# Altium footprint library ALL.PcbLib: 385 footprints (part 9 of 25)
Each footprint in its own frame and in the unit in brackets; x right, y up, seen from the top. Pads: shape width x height; smd on the part's side, far side on the other; paste and mask are expansions set on the pad; w line width, h text height; cw(c..) or ccw(c..) is an arc to the next point about the centre after c.
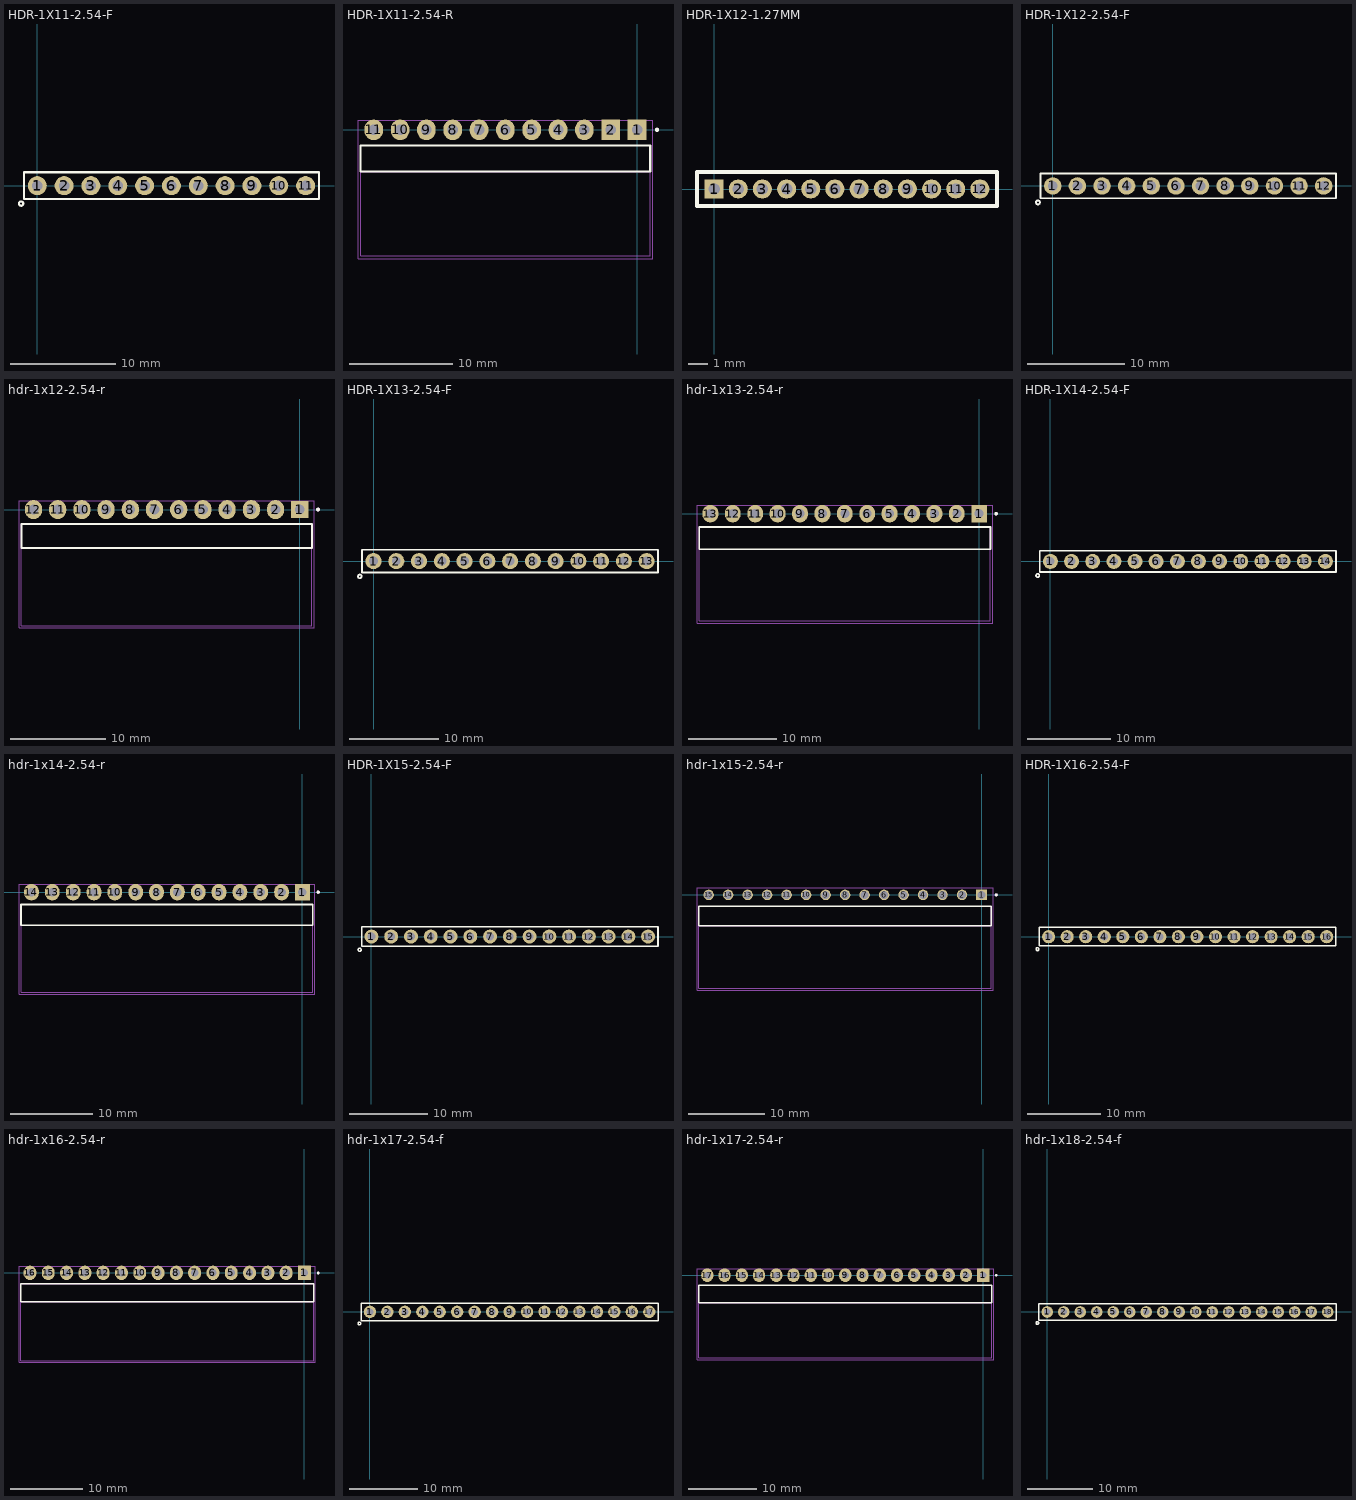
[diagram p8: the footprints below, top view; thin cyan lines are the x and y axes]

## HDR-1X11-2.54-F [mm]
pads (11):
  round 1.8 hole 1: 1(0,0) 2(2.54,0) 3(5.08,0) 4(7.62,0) 5(10.16,0) 6(12.7,0) 7(15.24,0) 8(17.78,0) 9(20.32,0) 10(22.86,0) 11(25.4,0)
Top Overlay:
  circle w0.2: c-1.53,-1.7 r0.2
  lines w0.2: -1.27,-1.27 26.67,-1.27 26.67,1.27 -1.27,1.27 -1.27,-1.27
3D body "PBD-2.stp": height 8.5, standoff -3.15, extent 19.05,-1.27 24.13,1.27
3D body "PBD-2.stp": height 8.5, standoff -3.15, extent 13.97,-1.27 19.05,1.27
3D body "PBD-2.stp": height 8.5, standoff -3.15, extent 8.89,-1.27 13.97,1.27
3D body "PBD-2.stp": height 8.5, standoff -3.15, extent 3.81,-1.27 8.89,1.27
3D body "PBD-2.stp": height 8.5, standoff -3.15, extent -1.27,-1.27 3.81,1.27
3D body "PBS-1.stp": height 8.5, standoff -3.15, extent 24.13,-1.27 26.67,1.27

## HDR-1X11-2.54-R [mm]
pads (11):
  rect 1.8x2 hole 1.02: 1(0,0) 2(-2.54,0)
  oval 1.8x2 hole 1.02: 3(-5.08,0) 4(-7.62,0) 5(-10.16,0) 6(-12.7,0) 7(-15.24,0) 8(-17.78,0) 9(-20.32,0) 10(-22.86,0) 11(-25.4,0)
Top Overlay:
  circle w0.2: c1.92,0 r0.1
  lines w0.2: -26.67,-4.04 -26.67,-1.5 1.27,-1.5 1.27,-4.04 -26.67,-4.04
Mechanical 13:
  circle w0.2: c1.92,0 r0.1
  lines w0.1: -26.67,-4.04 -26.67,-1.5 1.27,-1.5 1.27,-4.04 ; -26.67,-4.04 1.27,-4.04 ; -26.67,-4.04 -26.67,-12.17 1.27,-12.17 1.27,-4.04
Mechanical 15:
  lines w0.05: -26.92,-12.42 -26.92,0.935 1.52,0.935 1.52,-12.42 -26.92,-12.42
3D body "TSW-111-16-G-S-RA.stp": height 3.05, standoff -5.05, extent -26.67,-12.129 1.27,0.381

## HDR-1X12-1.27MM [mm]
pads (12):
  rect 1x1 hole 0.6: 1(0,0)
  round 1 hole 0.6: 2(1.27,0) 3(2.54,0) 4(3.81,0) 5(5.08,0) 6(6.35,0) 7(7.62,0) 8(8.89,0) 9(10.16,0) 10(11.43,0) 11(12.7,0) 12(13.97,0)
Top Overlay:
  lines w0.2: -0.9,-0.9 14.87,-0.9 14.87,0.9 -0.9,0.9 -0.9,-0.9
3D body "TMS-112-52-S-S.stp": height 7.75, standoff -3.05, extent -0.584,-1.245 14.656,1.194

## HDR-1X12-2.54-F [mm]
pads (12):
  round 1.8 hole 1: 1(0,0) 2(2.54,0) 3(5.08,0) 4(7.62,0) 5(10.16,0) 6(12.7,0) 7(15.24,0) 8(17.78,0) 9(20.32,0) 10(22.86,0) 11(25.4,0) 12(27.94,0)
Top Overlay:
  circle w0.2: c-1.53,-1.7 r0.2
  lines w0.2: -1.27,-1.27 29.21,-1.27 29.21,1.27 -1.27,1.27 -1.27,-1.27
3D body "PBD-2.stp": height 8.5, standoff -3.15, extent 24.13,-1.27 29.21,1.27
3D body "PBD-2.stp": height 8.5, standoff -3.15, extent 19.05,-1.27 24.13,1.27
3D body "PBD-2.stp": height 8.5, standoff -3.15, extent 13.97,-1.27 19.05,1.27
3D body "PBD-2.stp": height 8.5, standoff -3.15, extent 8.89,-1.27 13.97,1.27
3D body "PBD-2.stp": height 8.5, standoff -3.15, extent 3.81,-1.27 8.89,1.27
3D body "PBD-2.stp": height 8.5, standoff -3.15, extent -1.27,-1.27 3.81,1.27

## hdr-1x12-2.54-r [mm]
pads (12):
  rect 1.8x1.8 hole 1.02: 1(0,0)
  oval 1.8x2 hole 1.02: 2(-2.54,0) 3(-5.08,0) 4(-7.62,0) 5(-10.16,0) 6(-12.7,0) 7(-15.24,0) 8(-17.78,0) 9(-20.32,0) 10(-22.86,0) 11(-25.4,0) 12(-27.94,0)
Top Overlay:
  circle w0.2: c1.92,0 r0.1
  lines w0.2: -29.21,-4.04 -29.21,-1.5 1.27,-1.5 1.27,-4.04 -29.21,-4.04
Mechanical 13:
  circle w0.2: c1.92,0 r0.1
  lines w0.1: -29.21,-4.04 -29.21,-1.5 1.27,-1.5 1.27,-4.04 ; -29.21,-4.04 1.27,-4.04 ; -29.21,-4.04 -29.21,-12.17 1.27,-12.17 1.27,-4.04
Mechanical 15:
  lines w0.05: -29.46,-12.42 -29.46,0.935 1.52,0.935 1.52,-12.42 -29.46,-12.42
3D body "TSW-112-16-G-S-RA.stp": height 3.07, standoff -5.03, extent -29.337,-11.938 1.143,0.571

## HDR-1X13-2.54-F [mm]
pads (13):
  round 1.8 hole 1: 1(0,0) 2(2.54,0) 3(5.08,0) 4(7.62,0) 5(10.16,0) 6(12.7,0) 7(15.24,0) 8(17.78,0) 9(20.32,0) 10(22.86,0) 11(25.4,0) 12(27.94,0) 13(30.48,0)
Top Overlay:
  circle w0.2: c-1.53,-1.7 r0.2
  lines w0.2: -1.27,-1.27 31.75,-1.27 31.75,1.27 -1.27,1.27 -1.27,-1.27
3D body "PBS-1.stp": height 8.5, standoff -3.15, extent 29.21,-1.27 31.75,1.27
3D body "PBD-2.stp": height 8.5, standoff -3.15, extent -1.27,-1.27 3.81,1.27
3D body "PBD-2.stp": height 8.5, standoff -3.15, extent 3.81,-1.27 8.89,1.27
3D body "PBD-2.stp": height 8.5, standoff -3.15, extent 8.89,-1.27 13.97,1.27
3D body "PBD-2.stp": height 8.5, standoff -3.15, extent 13.97,-1.27 19.05,1.27
3D body "PBD-2.stp": height 8.5, standoff -3.15, extent 19.05,-1.27 24.13,1.27
3D body "PBD-2.stp": height 8.5, standoff -3.15, extent 24.13,-1.27 29.21,1.27

## hdr-1x13-2.54-r [mm]
pads (13):
  rect 1.8x2 hole 1.02: 1(0,0)
  oval 1.8x2 hole 1.02: 2(-2.54,0) 3(-5.08,0) 4(-7.62,0) 5(-10.16,0) 6(-12.7,0) 7(-15.24,0) 8(-17.78,0) 9(-20.32,0) 10(-22.86,0) 11(-25.4,0) 12(-27.94,0) 13(-30.48,0)
Top Overlay:
  circle w0.2: c1.92,0 r0.1
  lines w0.2: -31.75,-4.04 -31.75,-1.5 1.27,-1.5 1.27,-4.04 -31.75,-4.04
Mechanical 13:
  circle w0.2: c1.92,0 r0.1
  lines w0.1: -31.75,-4.04 -31.75,-1.5 1.27,-1.5 1.27,-4.04 ; -31.75,-4.04 1.27,-4.04 ; -31.75,-4.04 -31.75,-12.17 1.27,-12.17 1.27,-4.04
Mechanical 15:
  lines w0.05: -32,-12.42 -32,0.935 1.52,0.935 1.52,-12.42 -32,-12.42
3D body "TSW-113-16-G-S-RA.stp": height 3.07, standoff -5.03, extent -31.877,-12.319 1.143,0.191

## HDR-1X14-2.54-F [mm]
pads (14):
  round 1.8 hole 1: 1(0,0) 2(2.54,0) 3(5.08,0) 4(7.62,0) 5(10.16,0) 6(12.7,0) 7(15.24,0) 8(17.78,0) 9(20.32,0) 10(22.86,0) 11(25.4,0) 12(27.94,0) 13(30.48,0) 14(33.02,0)
Top Overlay:
  circle w0.2: c-1.53,-1.7 r0.2
  lines w0.2: -1.27,-1.27 -1.27,1.27 34.29,1.27 34.29,-1.27 -1.27,-1.27
3D body "PBD-2.stp": height 8.5, standoff -3.15, extent 29.21,-1.27 34.29,1.27
3D body "PBD-2.stp": height 8.5, standoff -3.15, extent 24.13,-1.27 29.21,1.27
3D body "PBD-2.stp": height 8.5, standoff -3.15, extent 19.05,-1.27 24.13,1.27
3D body "PBD-2.stp": height 8.5, standoff -3.15, extent 13.97,-1.27 19.05,1.27
3D body "PBD-2.stp": height 8.5, standoff -3.15, extent 8.89,-1.27 13.97,1.27
3D body "PBD-2.stp": height 8.5, standoff -3.15, extent 3.81,-1.27 8.89,1.27
3D body "PBD-2.stp": height 8.5, standoff -3.15, extent -1.27,-1.27 3.81,1.27

## hdr-1x14-2.54-r [mm]
pads (14):
  rect 1.8x2 hole 1.02: 1(0,0)
  oval 1.8x2 hole 1.02: 2(-2.54,0) 3(-5.08,0) 4(-7.62,0) 5(-10.16,0) 6(-12.7,0) 7(-15.24,0) 8(-17.78,0) 9(-20.32,0) 10(-22.86,0) 11(-25.4,0) 12(-27.94,0) 13(-30.48,0) 14(-33.02,0)
Top Overlay:
  circle w0.2: c1.92,0 r0.1
  lines w0.2: -34.29,-4.04 1.27,-4.04 1.27,-1.5 -34.29,-1.5 -34.29,-4.04
Mechanical 13:
  circle w0.2: c1.92,0 r0.1
  lines w0.1: -34.29,-4.04 -34.29,-12.17 1.27,-12.17 1.27,-4.04 ; -34.29,-4.04 1.27,-4.04 ; -34.29,-4.04 -34.29,-1.5 1.27,-1.5 1.27,-4.04
Mechanical 15:
  lines w0.05: -34.54,-12.42 1.52,-12.42 1.52,0.935 -34.54,0.935 -34.54,-12.42
3D body "TSW-114-16-G-S-RA.stp": height 3.07, standoff -5.03, extent -34.417,-12.319 1.143,0.191

## HDR-1X15-2.54-F [mm]
pads (15):
  round 1.8 hole 1: 1(0,0) 2(2.54,0) 3(5.08,0) 4(7.62,0) 5(10.16,0) 6(12.7,0) 7(15.24,0) 8(17.78,0) 9(20.32,0) 10(22.86,0) 11(25.4,0) 12(27.94,0) 13(30.48,0) 14(33.02,0) 15(35.56,0)
Top Overlay:
  circle w0.2: c-1.53,-1.7 r0.2
  lines w0.2: -1.27,-1.27 36.83,-1.27 36.83,1.27 -1.27,1.27 -1.27,-1.27
3D body "PBS-1.stp": height 8.5, standoff -3.15, extent 34.29,-1.27 36.83,1.27
3D body "PBD-2.stp": height 8.5, standoff -3.15, extent -1.27,-1.27 3.81,1.27
3D body "PBD-2.stp": height 8.5, standoff -3.15, extent 3.81,-1.27 8.89,1.27
3D body "PBD-2.stp": height 8.5, standoff -3.15, extent 8.89,-1.27 13.97,1.27
3D body "PBD-2.stp": height 8.5, standoff -3.15, extent 13.97,-1.27 19.05,1.27
3D body "PBD-2.stp": height 8.5, standoff -3.15, extent 19.05,-1.27 24.13,1.27
3D body "PBD-2.stp": height 8.5, standoff -3.15, extent 24.13,-1.27 29.21,1.27
3D body "PBD-2.stp": height 8.5, standoff -3.15, extent 29.21,-1.27 34.29,1.27

## hdr-1x15-2.54-r [mm]
pads (15):
  rect 1.37x1.37 hole 1.02: 1(0,0)
  round 1.37 hole 1.02: 2(-2.54,0) 3(-5.08,0) 4(-7.62,0) 5(-10.16,0) 6(-12.7,0) 7(-15.24,0) 8(-17.78,0) 9(-20.32,0) 10(-22.86,0) 11(-25.4,0) 12(-27.94,0) 13(-30.48,0) 14(-33.02,0) 15(-35.56,0)
Top Overlay:
  circle w0.2: c1.92,0 r0.1
  lines w0.2: -36.83,-4.04 1.27,-4.04 1.27,-1.5 -36.83,-1.5 -36.83,-4.04
Mechanical 13:
  circle w0.2: c1.92,0 r0.1
  lines w0.1: -36.83,-4.04 -36.83,-12.17 1.27,-12.17 1.27,-4.04 ; -36.83,-4.04 1.27,-4.04 ; -36.83,-4.04 -36.83,-1.5 1.27,-1.5 1.27,-4.04
Mechanical 15:
  lines w0.05: -37.08,-12.42 1.52,-12.42 1.52,0.935 -37.08,0.935 -37.08,-12.42
3D body "TSW-115-16-G-S-RA.stp": height 3.05, standoff -5.05, extent -36.83,-11.97 1.27,0.54

## HDR-1X16-2.54-F [mm]
pads (16):
  round 1.8 hole 1: 1(0,0) 2(2.54,0) 3(5.08,0) 4(7.62,0) 5(10.16,0) 6(12.7,0) 7(15.24,0) 8(17.78,0) 9(20.32,0) 10(22.86,0) 11(25.4,0) 12(27.94,0) 13(30.48,0) 14(33.02,0) 15(35.56,0) 16(38.1,0)
Top Overlay:
  circle w0.2: c-1.53,-1.7 r0.2
  lines w0.2: -1.27,-1.27 39.37,-1.27 39.37,1.27 -1.27,1.27 -1.27,-1.27
3D body "PBD-2.stp": height 8.5, standoff -3.15, extent 34.29,-1.27 39.37,1.27
3D body "PBD-2.stp": height 8.5, standoff -3.15, extent 29.21,-1.27 34.29,1.27
3D body "PBD-2.stp": height 8.5, standoff -3.15, extent 24.13,-1.27 29.21,1.27
3D body "PBD-2.stp": height 8.5, standoff -3.15, extent 19.05,-1.27 24.13,1.27
3D body "PBD-2.stp": height 8.5, standoff -3.15, extent 13.97,-1.27 19.05,1.27
3D body "PBD-2.stp": height 8.5, standoff -3.15, extent 8.89,-1.27 13.97,1.27
3D body "PBD-2.stp": height 8.5, standoff -3.15, extent 3.81,-1.27 8.89,1.27
3D body "PBD-2.stp": height 8.5, standoff -3.15, extent -1.27,-1.27 3.81,1.27

## hdr-1x16-2.54-r [mm]
pads (16):
  rect 1.8x2 hole 1.02: 1(0,0)
  oval 1.8x2 hole 1.02: 2(-2.54,0) 3(-5.08,0) 4(-7.62,0) 5(-10.16,0) 6(-12.7,0) 7(-15.24,0) 8(-17.78,0) 9(-20.32,0) 10(-22.86,0) 11(-25.4,0) 12(-27.94,0) 13(-30.48,0) 14(-33.02,0) 15(-35.56,0) 16(-38.1,0)
Top Overlay:
  circle w0.2: c1.92,0 r0.1
  lines w0.2: -39.37,-4.04 1.27,-4.04 1.27,-1.5 -39.37,-1.5 -39.37,-4.04
Mechanical 13:
  circle w0.2: c1.92,0 r0.1
  lines w0.1: -39.37,-4.04 -39.37,-12.17 1.27,-12.17 1.27,-4.04 ; -39.37,-4.04 1.27,-4.04 ; -39.37,-4.04 -39.37,-1.5 1.27,-1.5 1.27,-4.04
Mechanical 15:
  lines w0.05: -39.62,-12.42 1.52,-12.42 1.52,0.935 -39.62,0.935 -39.62,-12.42
3D body "TSW-116-16-G-S-RA.stp": height 3.27, standoff -4.83, extent -39.37,-12.128 1.27,0.381

## hdr-1x17-2.54-f [mm]
pads (17):
  round 1.8 hole 1: 1(0,0) 2(2.54,0) 3(5.08,0) 4(7.62,0) 5(10.16,0) 6(12.7,0) 7(15.24,0) 8(17.78,0) 9(20.32,0) 10(22.86,0) 11(25.4,0) 12(27.94,0) 13(30.48,0) 14(33.02,0) 15(35.56,0) 16(38.1,0) 17(40.64,0)
Top Overlay:
  circle w0.2: c-1.53,-1.7 r0.2
  lines w0.2: -1.27,-1.27 -1.27,1.27 41.91,1.27 41.91,-1.27 -1.27,-1.27
3D body "PBD-2.stp": height 8.5, standoff -3.15, extent 34.29,-1.27 39.37,1.27
3D body "PBD-2.stp": height 8.5, standoff -3.15, extent 29.21,-1.27 34.29,1.27
3D body "PBD-2.stp": height 8.5, standoff -3.15, extent 24.13,-1.27 29.21,1.27
3D body "PBD-2.stp": height 8.5, standoff -3.15, extent 19.05,-1.27 24.13,1.27
3D body "PBD-2.stp": height 8.5, standoff -3.15, extent 13.97,-1.27 19.05,1.27
3D body "PBD-2.stp": height 8.5, standoff -3.15, extent 8.89,-1.27 13.97,1.27
3D body "PBD-2.stp": height 8.5, standoff -3.15, extent 3.81,-1.27 8.89,1.27
3D body "PBD-2.stp": height 8.5, standoff -3.15, extent -1.27,-1.27 3.81,1.27
3D body "PBS-1.stp": height 8.5, standoff -3.15, extent 39.37,-1.27 41.91,1.27

## hdr-1x17-2.54-r [mm]
pads (17):
  rect 1.8x2 hole 1.02: 1(0,0)
  oval 1.8x2 hole 1.02: 2(-2.54,0) 3(-5.08,0) 4(-7.62,0) 5(-10.16,0) 6(-12.7,0) 7(-15.24,0) 8(-17.78,0) 9(-20.32,0) 10(-22.86,0) 11(-25.4,0) 12(-27.94,0) 13(-30.48,0) 14(-33.02,0) 15(-35.56,0) 16(-38.1,0) 17(-40.64,0)
Top Overlay:
  circle w0.2: c1.92,0 r0.1
  lines w0.2: -41.91,-4.04 -41.91,-1.5 1.27,-1.5 1.27,-4.04 -41.91,-4.04
Mechanical 13:
  circle w0.2: c1.92,0 r0.1
  lines w0.1: -41.91,-4.04 -41.91,-1.5 1.27,-1.5 1.27,-4.04 ; -41.91,-4.04 1.27,-4.04 ; -41.91,-4.04 -41.91,-12.17 1.27,-12.17 1.27,-4.04
Mechanical 15:
  lines w0.05: -42.16,-12.42 -42.16,0.935 1.52,0.935 1.52,-12.42 -42.16,-12.42
3D body "TSW-117-16-G-S-RA.stp": height 3.27, standoff -4.83, extent -41.783,-12.224 1.397,0.286

## hdr-1x18-2.54-f [mm]
pads (18):
  round 1.8 hole 1: 1(0,0) 2(2.54,0) 3(5.08,0) 4(7.62,0) 5(10.16,0) 6(12.7,0) 7(15.24,0) 8(17.78,0) 9(20.32,0) 10(22.86,0) 11(25.4,0) 12(27.94,0) 13(30.48,0) 14(33.02,0) 15(35.56,0) 16(38.1,0) 17(40.64,0) 18(43.18,0)
Top Overlay:
  circle w0.2: c-1.53,-1.7 r0.2
  lines w0.2: -1.27,-1.27 44.45,-1.27 44.45,1.27 -1.27,1.27 -1.27,-1.27
3D body "PBD-2.stp": height 8.5, standoff -3.15, extent -1.27,-1.27 3.81,1.27
3D body "PBD-2.stp": height 8.5, standoff -3.15, extent 3.81,-1.27 8.89,1.27
3D body "PBD-2.stp": height 8.5, standoff -3.15, extent 8.89,-1.27 13.97,1.27
3D body "PBD-2.stp": height 8.5, standoff -3.15, extent 13.97,-1.27 19.05,1.27
3D body "PBD-2.stp": height 8.5, standoff -3.15, extent 19.05,-1.27 24.13,1.27
3D body "PBD-2.stp": height 8.5, standoff -3.15, extent 24.13,-1.27 29.21,1.27
3D body "PBD-2.stp": height 8.5, standoff -3.15, extent 29.21,-1.27 34.29,1.27
3D body "PBD-2.stp": height 8.5, standoff -3.15, extent 34.29,-1.27 39.37,1.27
3D body "PBD-2.stp": height 8.5, standoff -3.15, extent 39.37,-1.27 44.45,1.27